# Altium footprint library SMD_Bauteile.PcbLib: 355 footprints (part 22 of 23)
Each footprint in its own frame and in the unit in brackets; x right, y up, seen from the top. Pads: shape width x height; smd on the part's side, far side on the other; paste and mask are expansions set on the pad; w line width, h text height; cw(c..) or ccw(c..) is an arc to the next point about the centre after c.
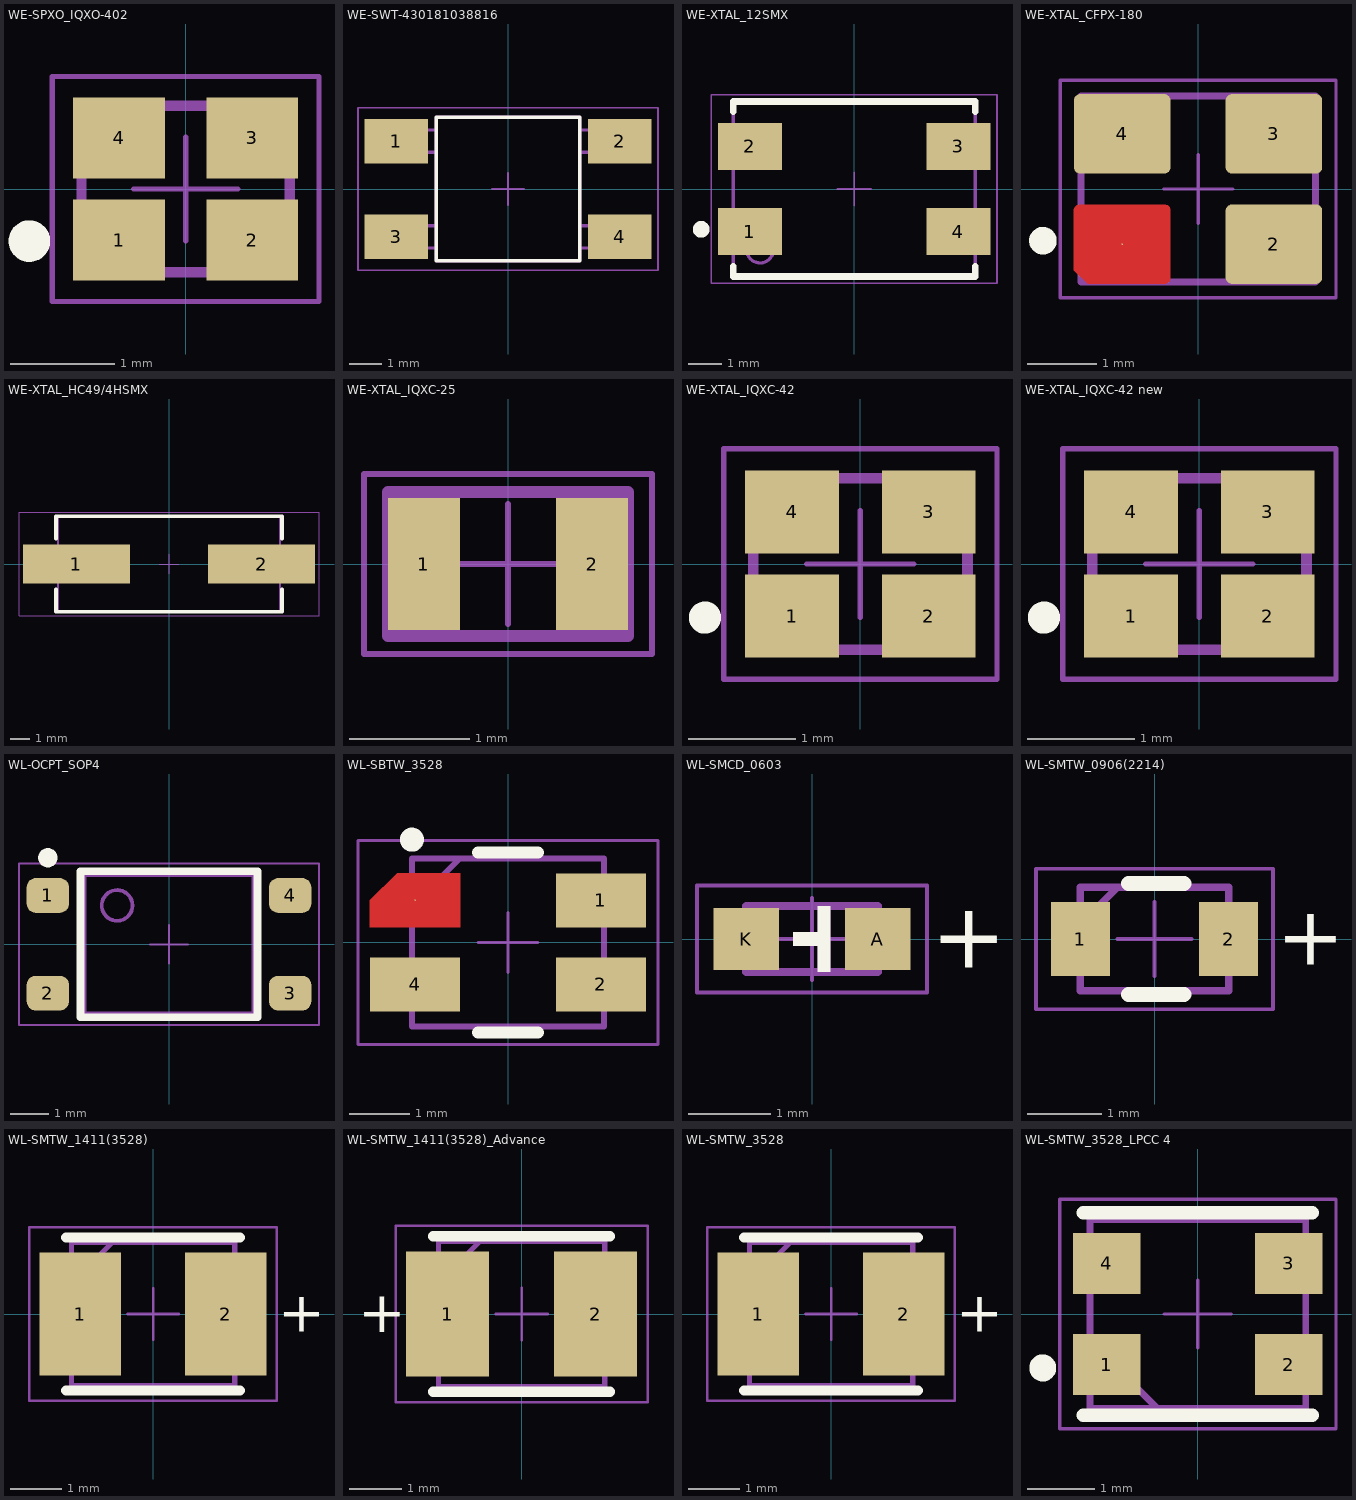
[diagram p21: the footprints below, top view; thin cyan lines are the x and y axes]

## WE-SPXO_IQXO-402 [mm] "Crystal Oscillator, SMT, IQXO-402"
height 0.8
pads (4):
  rect 0.88x0.78 smd mask+0: 1(-0.64,-0.49) 2(0.64,-0.49) 3(0.64,0.49) 4(-0.64,0.49)
Top Overlay:
  circle w0.2: c-1.5,-0.5 r0.1
Dimensions:
  circle w0.075: c-0.7,-0.5 r0.15
  lines w0.1: -1,-0.8 -1,0.8 1,0.8 1,-0.8 -1,-0.8
Mech Misc 1:
  circle w0.075: c-0.7,-0.5 r0.15
  lines w0.1: -1,-0.8 1,-0.8 1,0.8 -1,0.8 -1,-0.8
Mech 15:
  lines w0.05: -0.5,0 0.5,0 ; 0,-0.5 0,0.5 ; -1.28,-1.08 1.28,-1.08 1.28,1.08 -1.28,1.08 -1.28,-1.08
3D body "IQXO-402.stp": height 0.8, standoff 0, extent -1,-0.8 1,0.8

## WE-SWT-430181038816 [mm] "Tact Switch, SMD, body 4.5x4.5mm"
height 3.8
pads (4):
  rect 2x1.4 smd: 1(-3.5,1.5) 2(3.5,1.5) 3(-3.5,-1.5) 4(3.5,-1.5)
Top Overlay:
  lines w0.1: -2.25,-2.25 2.25,-2.25 2.25,2.25 -2.25,2.25 -2.25,-2.25
Mech Misc 1:
  lines w0.1: -2.25,-1.85 -3.75,-1.85 -3.75,-1.15 -2.25,-1.15 ; -2.25,1.15 -3.75,1.15 -3.75,1.85 -2.25,1.85 ; 2.25,-1.85 3.75,-1.85 3.75,-1.15 2.25,-1.15 ; 2.25,1.15 3.75,1.15 3.75,1.85 2.25,1.85 ; -2.25,-2.25 2.25,-2.25 2.25,2.25 -2.25,2.25 -2.25,-2.25
Mech 15:
  lines w0.05: -0.5,0 0.5,0 ; 0,-0.5 0,0.5 ; -4.7,-2.55 4.7,-2.55 4.7,2.55 -4.7,2.55 -4.7,-2.55
3D body "430181038816.stp": height 3.8, standoff 0, extent -3.75,-2.25 3.75,2.25

## WE-XTAL_12SMX [mm] "Quartz Crystal, size 12SMX, body 7.5x5.2mm"
height 1.2
pads (4):
  rect 1.9x1.4 smd: 1(-3.1,-1.27) 2(-3.1,1.27) 3(3.1,1.27) 4(3.1,-1.27)
Top Overlay:
  circle w0.25: c-4.55,-1.2 r0.125
  lines w0.2: -3.6,-2.3 -3.6,-2.6 3.6,-2.6 3.6,-2.3 ; -3.6,2.3 -3.6,2.6 3.6,2.6 3.6,2.3
Bottom Designator:
  lines w0.05: -0.5,0 0.5,0 ; 0,-0.5 0,0.5 ; -4.25,-2.8 -4.25,2.8 4.25,2.8 4.25,-2.8 -4.25,-2.8
Top Courtyard (Mech14):
  circle w0.1: c-2.8,-1.8 r0.4
  lines w0.1: -3.6,-2.6 -3.6,2.6 3.6,2.6 3.6,-2.6 -3.6,-2.6
Mechanical 18:
  lines w0.1: -3.6,-2.6 3.6,-2.6 3.6,2.6 -3.6,2.6 -3.6,-2.6
Top 3D Body:
  text ".Designator" at -7.498,-0.5 h1.5
3D body "FrqXTAL_12SMX-B.stp": height 1.1, standoff 0, extent -3.75,-2.6 3.75,2.6

## WE-XTAL_CFPX-180 [mm] "Quartz Crystal, size CFPX-180, body 3.4x2.7mm"
height 0.8
pads (4):
  round 0.025 smd: 1(-1.1,-0.8)
  rrect15% 1.4x1.15 smd: 2(1.1,-0.8) 3(1.1,0.8) 4(-1.1,0.8)
Top Layer:
  region: -1.8,-1.175 -1.8,-0.311 -1.8,-0.294 -1.787,-0.262 -1.763,-0.238 -1.731,-0.225 -1.714,-0.225 -0.486,-0.225 -0.469,-0.225 -0.437,-0.238 -0.413,-0.262 -0.4,-0.294 -0.4,-0.311 -0.4,-1.289 -0.4,-1.306 -0.413,-1.338 -0.437,-1.362 -0.469,-1.375 -0.486,-1.375 -1.6,-1.375
Top Overlay:
  circle w0.2: c-2.25,-0.75 r0.1
Top Component Center:
  lines w0.05: -0.5,0 0.5,0 ; 0,-0.5 0,0.5
Top Component Outline:
  circle w0.1: c-1.25,-0.9 r0.2
  lines w0.1: -1.7,-1.35 -1.7,1.35 1.7,1.35 1.7,-1.35 -1.7,-1.35
Top Courtyard (Mech26):
  lines w0.05: -2,-1.575 2,-1.575 2,1.575 -2,1.575 -2,-1.575
Top Designator:
  text ".Designator" at -4.998,-0.333 h1
3D body "FrqXTAL_CFPX-180.stp": height 0.65, standoff 0, extent -1.7,-1.35 1.7,1.35

## WE-XTAL_HC49/4HSMX [mm] "Quartz Crystal, size HC49/4HSMX, body 11.4x4.9mm"
height 4.3
pads (2):
  rect 5.5x2 smd: 1(-4.75,0) 2(4.75,0)
Top Overlay:
  lines w0.2: -5.8,-1.3 -5.8,-2.45 5.8,-2.45 5.8,-1.3 ; -5.8,1.3 -5.8,2.45 5.8,2.45 5.8,1.3
Mech Misc 1:
  lines w0.1: -5.7,-2.45 5.7,-2.45 5.7,2.45 -5.7,2.45 -5.7,-2.45
Mech 15:
  lines w0.05: -0.5,0 0.5,0 ; 0,-0.5 0,0.5 ; -7.7,-2.65 7.7,-2.65 7.7,2.65 -7.7,2.65 -7.7,-2.65
3D body "FrqXTAL_HC49-4HSMX.stp": height 4.3, standoff 0, extent -6.7,-2.45 6.7,2.45

## WE-XTAL_IQXC-25 [mm] "Quartz Crystal, size IQXC-25, body 2x1mm"
height 0.6
pads (2):
  rect 0.6x1.1 smd: 1(-0.7,0) 2(0.7,0)
Bottom Designator:
  lines w0.05: -0.5,0 0.5,0 ; 0,-0.5 0,0.5 ; -1.2,-0.75 1.2,-0.75 1.2,0.75 -1.2,0.75 -1.2,-0.75
Top Courtyard (Mech14):
  lines w0.1: -1,-0.6 -1,0.6 1,0.6 1,-0.6 -1,-0.6
Mechanical 18:
  lines w0.1: -1,-0.6 1,-0.6 1,0.6 -1,0.6 -1,-0.6
Top 3D Body:
  text ".Designator" at -3.499,-0.233 h0.7
3D body "FrqXTAL_IQXC-25.stp": height 0.55, standoff 0, extent -1,-0.6 1,0.6

## WE-XTAL_IQXC-42 [mm] "Quartz Crystal, size IQXC-42, body 2x1.6mm"
height 0.5
pads (4):
  rect 0.875x0.775 smd mask+0: 1(-0.637,-0.487) 2(0.638,-0.487) 3(0.638,0.487) 4(-0.637,0.487)
Top Overlay:
  circle w0.15: c-1.45,-0.5 r0.075
Dimensions:
  circle w0.075: c-0.6,-0.4 r0.15
  lines w0.1: -1,-0.8 -1,0.8 1,0.8 1,-0.8 -1,-0.8
Mech Misc 1:
  lines w0.1: -1,-0.8 1,-0.8 1,0.8 -1,0.8 -1,-0.8
Mech 15:
  lines w0.05: -0.5,0 0.5,0 ; 0,-0.5 0,0.5 ; -1.275,-1.075 1.275,-1.075 1.275,1.075 -1.275,1.075 -1.275,-1.075
3D body "FrqXTAL_IQXC-42.stp": height 0.5, standoff 0, extent -1,-0.8 1,0.8

## WE-XTAL_IQXC-42 new [mm] "Quartz Crystal, size IQXC-42, body 2x1.6mm"
height 0.5
pads (4):
  rect 0.875x0.775 smd: 1(-0.637,-0.487) 2(0.638,-0.487) 3(0.638,0.487) 4(-0.637,0.487)
Top Overlay:
  circle w0.15: c-1.45,-0.5 r0.075
Bottom Designator:
  lines w0.05: -0.5,0 0.5,0 ; 0,-0.5 0,0.5 ; -1.275,-1.075 -1.275,1.075 1.275,1.075 1.275,-1.075 -1.275,-1.075
Top Courtyard (Mech14):
  circle w0.075: c-0.6,-0.4 r0.15
  lines w0.1: -1,-0.8 1,-0.8 1,0.8 -1,0.8 -1,-0.8
Mechanical 18:
  lines w0.1: -1,-0.8 -1,0.8 1,0.8 1,-0.8 -1,-0.8
Top 3D Body:
  text ".Designator" at -3.499,-0.233 h0.7
3D body "FrqXTAL_IQXC-42.stp": height 0.5, standoff 0, extent -1,-0.8 1,0.8

## WL-OCPT_SOP4 [mm] "Optocoupler Phototransistor, body 4.4x3.6mm"
height 2.1
pads (4):
  rrect50% 1.1x0.9 smd: 1(-3.15,1.27) 2(-3.15,-1.27) 3(3.15,-1.27) 4(3.15,1.27)
Top Overlay:
  circle w0.25: c-3.15,2.25 r0.125
  lines w0.2: -2.3,-1.9 2.3,-1.9 2.3,1.9 -2.3,1.9 -2.3,-1.9
Bottom Designator:
  lines w0.05: -0.5,0 0.5,0 ; 0,-0.5 0,0.5 ; -3.9,-2.1 -3.9,2.1 3.9,2.1 3.9,-2.1 -3.9,-2.1
Top Courtyard (Mech14):
  circle w0.1: c-1.35,1.01 r0.4
  lines w0.1: -2.2,-1.8 2.2,-1.8 2.2,1.8 -2.2,1.8 -2.2,-1.8
Mechanical 18:
  circle w0.1: c-1.35,1.01 r0.4
  lines w0.1: -2.2,-1.8 -2.2,1.8 2.2,1.8 2.2,-1.8 -2.2,-1.8
Top 3D Body:
  text ".Designator" at -4.998,-0.333 h1
3D body "WL-OCPT_140356xxx.stp": height 2.1, standoff 0, extent -3.5,-1.8 3.5,1.8

## WL-SBTW_3528 [mm] "SMD Bi-color TOP LED, body 3.2x2.8mm"
height 1.9
pads (4):
  rect 1.5x0.9 smd: 1(1.55,0.7) 2(1.55,-0.7) 4(-1.55,-0.7)
  round 0.025 smd: 3(-1.55,0.7)
Top Layer:
  region: -0.8,0.25 -2.3,0.25 -2.3,0.7 -1.85,1.15 -0.8,1.15
Top Overlay:
  circle w0.2: c-1.6,1.71 r0.1
  lines w0.2: -0.5,-1.5 0.5,-1.5 ; -0.5,1.5 0.5,1.5
Top Component Center:
  lines w0.05: -0.5,0 0.5,0 ; 0,-0.5 0,0.5
Top Component Outline:
  lines w0.1: -1.6,0.6 -0.8,1.4 ; -1.6,-1.4 1.6,-1.4 1.6,1.4 -1.6,1.4 -1.6,-1.4
Top Courtyard (Mech26):
  lines w0.05: -2.5,-1.7 -2.5,1.7 2.5,1.7 2.5,-1.7 -2.5,-1.7
Top Designator:
  text ".Designator" at -3.499,-0.233 h0.7
3D body "Download_STP_WL-SBTW-3528 (rev1).stp": height 1.9, standoff 0, extent -1.75,-1.4 1.75,1.4

## WL-SMCD_0603 [mm] "SMD Mono-color Chip LED, body 1.6x0.8mm"
height 0.4
pads (2):
  rect 0.8x0.75 smd: A(0.8,0) K(-0.8,0)
Top Overlay:
  region: 0.22,0.4 0.22,-0.4 0.07,-0.4 0.07,-0.08 -0.23,-0.08 -0.23,0.08 0.07,0.08 0.07,0.4
  text "+" at 1.45,-0.35 h0.8
Bottom Designator:
  lines w0.05: -0.5,0 0.5,0 ; 0,-0.5 0,0.5 ; -1.4,-0.65 1.4,-0.65 1.4,0.65 -1.4,0.65 -1.4,-0.65
Top Courtyard (Mech14):
  region: 0.22,0.4 0.22,-0.4 0.07,-0.4 0.07,-0.08 -0.23,-0.08 -0.23,0.08 0.07,0.08 0.07,0.4
  lines w0.1: -0.8,-0.4 0.8,-0.4 0.8,0.4 -0.8,0.4 -0.8,-0.4
Top 3D Body:
  text ".Designator" at -2.499,-0.167 h0.5
3D body "STEP-WL-SMCD-0603-rev1.stp": height 0.42, standoff 0.02, extent -0.8,-0.4 0.8,0.4

## WL-SMTW_0906(2214) [mm] "SMD Mono-color TOP LED, body 2x1.4mm"
height 1.31
pads (2):
  rect 0.8x1 smd: 1(-1,0) 2(1,0)
Top Overlay:
  lines w0.2: -0.35,-0.75 0.4,-0.75 ; -0.35,0.75 0.4,0.75
  text "+" at 1.65,-0.35 h0.8
Mech Misc 1:
  lines w0.1: -1,0.2 -0.5,0.7 ; -1,-0.7 1,-0.7 1,0.7 -1,0.7 -1,-0.7
Mech 15:
  lines w0.05: -0.5,0 0.5,0 ; 0,-0.5 0,0.5 ; -1.6,-0.95 -1.6,0.95 1.6,0.95 1.6,-0.95 -1.6,-0.95
3D body "150224xx73100.stp": height 1.3, standoff -0.01, extent -1.15,-0.7 1.15,0.7

## WL-SMTW_1411(3528) [mm] "SMD Mono-color TOP LED, body 3.2x2.8mm"
height 1.9
pads (2):
  rect 1.6x2.4 smd: 1(-1.425,0) 2(1.425,0)
Top Overlay:
  lines w0.2: -1.7,-1.5 1.7,-1.5 ; -1.7,1.5 1.7,1.5
  text "+" at 2.45,-0.35 h0.8
Mech Misc 1:
  lines w0.1: -1.6,0.6 -0.8,1.4 ; -1.6,-1.4 1.6,-1.4 1.6,1.4 -1.6,1.4 -1.6,-1.4
Mech 15:
  lines w0.05: -0.5,0 0.5,0 ; 0,-0.5 0,0.5 ; -2.425,-1.7 2.425,-1.7 2.425,1.7 -2.425,1.7 -2.425,-1.7
3D body "150141xxx.stp": height 1.9, standoff 0, extent -1.75,-1.4 1.75,1.4

## WL-SMTW_1411(3528)_Advance [mm] "SMD Mono-color TOP LED, body 3.2x2.8mm"
height 1.9
pads (2):
  rect 1.6x2.4 smd: 1(-1.425,0) 2(1.425,0)
Top Overlay:
  lines w0.2: -1.7,-1.5 1.7,-1.5 ; -1.7,1.5 1.7,1.5
  text "+" at -3.15,-0.35 h0.8
Mech Misc 1:
  lines w0.1: -1.6,0.6 -0.8,1.4 ; -1.6,-1.4 -1.6,1.4 1.6,1.4 1.6,-1.4 -1.6,-1.4
Mech 15:
  lines w0.05: -0.5,0 0.5,0 ; 0,-0.5 0,0.5 ; -2.425,-1.7 -2.425,1.7 2.425,1.7 2.425,-1.7 -2.425,-1.7
3D body "150141xxx73113.stp": height 1.9, standoff 0, extent -1.75,-1.4 1.75,1.4

## WL-SMTW_3528 [mm] "SMD Mono-color TOP LED, body 3.2x2.8mm"
height 1.9
pads (2):
  rect 1.6x2.4 smd: 1(-1.425,0) 2(1.425,0)
Top Overlay:
  lines w0.2: -1.7,-1.5 1.7,-1.5 ; -1.7,1.5 1.7,1.5
  text "+" at 2.45,-0.35 h0.8
Dimensions:
  lines w0.1: -1.6,0.6 -0.8,1.4 ; -1.6,-1.4 1.6,-1.4 1.6,1.4 -1.6,1.4 -1.6,-1.4
  text ".Designator" at -1.16,-0.5 h1
Mech Misc 1:
  lines w0.1: -1.6,0.6 -0.8,1.4 ; -1.6,-1.4 -1.6,1.4 1.6,1.4 1.6,-1.4 -1.6,-1.4
Mech 15:
  lines w0.05: -0.5,0 0.5,0 ; 0,-0.5 0,0.5 ; -2.425,-1.7 2.425,-1.7 2.425,1.7 -2.425,1.7 -2.425,-1.7
3D body "150141xxx.stp": height 1.9, standoff 0, extent -1.75,-1.4 1.75,1.4

## WL-SMTW_3528_LPCC 4 [mm] "SMD Mono-color TOP LED, body 3.5x2.8mm"
height 1.85
pads (4):
  rect 1x0.9 smd: 1(-1.35,-0.75) 2(1.35,-0.75) 3(1.35,0.75) 4(-1.35,0.75)
Top Overlay:
  circle w0.2: c-2.3,-0.8 r0.1
  lines w0.2: -1.7,-1.5 1.7,-1.5 ; -1.7,1.5 1.7,1.5
Dimensions:
  lines w0.1: -1.6,-0.4 -0.6,-1.4 ; -1.6,-1.4 -1.6,1.4 1.6,1.4 1.6,-1.4 -1.6,-1.4
  text ".Designator" at -1.16,-0.5 h1
Mech Misc 1:
  lines w0.1: -1.6,-0.4 -0.6,-1.4 ; -1.6,-1.4 1.6,-1.4 1.6,1.4 -1.6,1.4 -1.6,-1.4
Mech 15:
  lines w0.05: -0.5,0 0.5,0 ; 0,-0.5 0,0.5 ; -2.05,-1.7 2.05,-1.7 2.05,1.7 -2.05,1.7 -2.05,-1.7
3D body "150141xxx73130.stp": height 1.86, standoff 0, extent -1.75,-1.4 1.75,1.4